# Altium footprint library 3M THD.PcbLib: 163 footprints (part 6 of 14) (continued)
## 3M_N3314-6302RB_a [mm] "3M, 3000 Series, 14 Contacts - Pitch 2.54mm - Straight Four-Wall Header (Black) With Long Roll Pin Latch/Ejectors" (continued)
  text "14" at 9.05,1.525 h1.2
3D body "3M_N3314-6302RB_a.stp": height 27.18, standoff -2.84, extent -18.542,-4.318 18.542,4.318

## 3M_N3408-5202RB [mm] "3M, 3000 Series, 16 Contacts - Pitch 2.54mm - Right Angle Four-Wall Header (Black) With Short Roll Pin Latch/Ejectors"
height 8.6
pads (18):
  round 1.6 hole 0.9: 1(-8.89,-1.27) 2(-8.89,1.27) 3(-6.35,-1.27) 4(-6.35,1.27) 5(-3.81,-1.27) 6(-3.81,1.27) 7(-1.27,-1.27) 8(-1.27,1.27) 9(1.27,-1.27) 10(1.27,1.27) 11(3.81,-1.27) 12(3.81,1.27) 13(6.35,-1.27) 14(6.35,1.27) 15(8.89,-1.27) 16(8.89,1.27)
  round 4.6 hole 2.8: MTG1(-14.796,0.533) MTG2(14.796,0.533)
Top Overlay:
  circle w0.3: c-8.963,-3.048 r0.15
  circle w0.2: c-14.478,6.375 r0.787
  circle w0.2: c14.478,6.375 r0.787
  lines w0.2: -23.217,9.877 -20.639,14.342 ccw(c-20.727,14.393) -20.676,14.481 -23.591,16.163 -28.696,13.216 ccw(c-28.645,13.128) -28.696,13.04 -21.707,9.005 -19.395,6.25 ; -21.604,12.67 -17.848,10.502 ; -17.297,-2.007 -19.812,-2.007 -19.812,5.105 -16.484,14.249 -15.642,14.249 ccw(c-14.478,14.757) -13.208,14.757 -12.366,14.757 -11.924,12.251 ccw(c-10.673,12.471) -10.673,11.201 10.673,11.201 ccw(c10.673,12.471) 11.924,12.251 12.366,14.757 13.208,14.757 ccw(c14.478,14.757) 15.642,14.249 16.484,14.249 19.812,5.105 19.812,-2.007 17.297,-2.007 ; -12.294,-2.007 -10,-2.007 ; -10.154,11.201 -8.884,9.002 -8.347,9.931 ; -8.579,11.201 -8.579,9.931 -6.661,9.931 -6.668,11.201 ; -2.032,5.105 2.032,5.105 ; -2.032,11.201 -2.032,3.581 2.032,3.581 2.032,11.201 ; -1.587,5.105 -1.587,11.201 ; -0.953,5.105 -0.953,11.201 ; 0.953,5.105 0.953,11.201 ; 1.587,5.105 1.587,11.201 ; 6.668,11.201 6.661,9.931 8.579,9.931 8.573,11.201 ; 10,-2.007 12.294,-2.007 ; 17.848,10.502 21.604,12.67 ; 19.395,6.25 21.707,9.005 28.696,13.04 ccw(c28.645,13.128) 28.696,13.216 23.591,16.163 20.676,14.481 ccw(c20.727,14.393) 20.639,14.342 23.217,9.877
  text "16" at 10.15,0.889 h1.02
  text "1" at -10.922,-1.7 h1.02
Mechanical 8:
  lines w0.1: -15.796,0.533 -14.796,0.533 ; -14.796,-0.467 -14.796,0.533 ; -14.796,1.533 -14.796,0.533 ; -13.796,0.533 -14.796,0.533 ; -9.89,-1.27 -8.89,-1.27 ; -9.89,1.27 -8.89,1.27 ; -8.89,-2.27 -8.89,-1.27 ; -8.89,-0.27 -8.89,-1.27 ; -8.89,0.27 -8.89,1.27 ; -8.89,2.27 -8.89,1.27 ; -7.89,-1.27 -8.89,-1.27 ; -7.89,1.27 -8.89,1.27 ; -7.35,-1.27 -6.35,-1.27 ; -7.35,1.27 -6.35,1.27 ; -6.35,-2.27 -6.35,-1.27 ; -6.35,-0.27 -6.35,-1.27 ; -6.35,0.27 -6.35,1.27 ; -6.35,2.27 -6.35,1.27 ; -5.35,-1.27 -6.35,-1.27 ; -5.35,1.27 -6.35,1.27 ; -4.81,-1.27 -3.81,-1.27 ; -4.81,1.27 -3.81,1.27 ; -3.81,-2.27 -3.81,-1.27 ; -3.81,-0.27 -3.81,-1.27 ; -3.81,0.27 -3.81,1.27 ; -3.81,2.27 -3.81,1.27 ; -2.81,-1.27 -3.81,-1.27 ; -2.81,1.27 -3.81,1.27 ; -2.27,-1.27 -1.27,-1.27 ; -2.27,1.27 -1.27,1.27 ; -1.27,-2.27 -1.27,-1.27 ; -1.27,-0.27 -1.27,-1.27 ; -1.27,0.27 -1.27,1.27 ; -1.27,2.27 -1.27,1.27 ; -1,0 0,0 ; -0.27,-1.27 -1.27,-1.27 ; -0.27,1.27 -1.27,1.27 ; 0,-1 0,0 ; 0,1 0,0 ; 0.27,-1.27 1.27,-1.27 ; 0.27,1.27 1.27,1.27 ; 1,0 0,0 ; 1.27,-2.27 1.27,-1.27 ; 1.27,-0.27 1.27,-1.27 ; 1.27,0.27 1.27,1.27 ; 1.27,2.27 1.27,1.27 ; 2.27,-1.27 1.27,-1.27 ; 2.27,1.27 1.27,1.27 ; 2.81,-1.27 3.81,-1.27 ; 2.81,1.27 3.81,1.27 ; 3.81,-2.27 3.81,-1.27 ; 3.81,-0.27 3.81,-1.27 ; 3.81,0.27 3.81,1.27 ; 3.81,2.27 3.81,1.27 ; 4.81,-1.27 3.81,-1.27 ; 4.81,1.27 3.81,1.27 ; 5.35,-1.27 6.35,-1.27 ; 5.35,1.27 6.35,1.27 ; 6.35,-2.27 6.35,-1.27 ; 6.35,-0.27 6.35,-1.27 ; 6.35,0.27 6.35,1.27 ; 6.35,2.27 6.35,1.27 ; 7.35,-1.27 6.35,-1.27 ; 7.35,1.27 6.35,1.27 ; 7.89,-1.27 8.89,-1.27 ; 7.89,1.27 8.89,1.27 ; 8.89,-2.27 8.89,-1.27 ; 8.89,-0.27 8.89,-1.27 ; 8.89,0.27 8.89,1.27 ; 8.89,2.27 8.89,1.27 ; 9.89,-1.27 8.89,-1.27 ; 9.89,1.27 8.89,1.27 ; 13.796,0.533 14.796,0.533 ; 14.796,-0.467 14.796,0.533 ; 14.796,1.533 14.796,0.533 ; 15.796,0.533 14.796,0.533
Mechanical 14:
  circle w0.1: c-14.478,6.375 r0.787
  circle w0.1: c14.478,6.375 r0.787
  circle w0.1: c14.796,0.533 r1.27
  circle w0.1: c-14.796,0.533 r1.27
  lines w0.1: -23.217,9.877 -20.639,14.342 ccw(c-20.727,14.393) -20.676,14.481 -23.591,16.163 -28.696,13.216 ccw(c-28.645,13.128) -28.696,13.04 -21.707,9.005 -19.395,6.25 ; -21.604,12.67 -17.848,10.502 ; -17.297,-2.007 -17.297,1.978 -14.796,3.422 -12.294,1.978 -12.294,-2.007 ; -10.154,11.201 -8.884,9.002 -8.347,9.931 ; -8.579,11.201 -8.579,9.931 -6.661,9.931 -6.668,11.201 ; -2.032,5.105 2.032,5.105 ; -2.032,11.201 -2.032,3.581 2.032,3.581 2.032,11.201 ; -1.587,5.105 -1.587,11.201 ; -0.953,5.105 -0.953,11.201 ; 0.953,5.105 0.953,11.201 ; 1.587,5.105 1.587,11.201 ; 6.668,11.201 6.661,9.931 8.579,9.931 8.573,11.201 ; 12.294,-2.007 12.294,1.978 14.796,3.422 17.297,1.978 17.297,-2.007 ; 17.848,10.502 21.604,12.67 ; 19.395,6.25 21.707,9.005 28.696,13.04 ccw(c28.645,13.128) 28.696,13.216 23.591,16.163 20.676,14.481 ccw(c20.727,14.393) 20.639,14.342 23.217,9.877 ; -19.812,-2.007 -19.812,5.105 -16.484,14.249 -15.642,14.249 ccw(c-14.478,14.757) -13.208,14.757 -12.366,14.757 -11.924,12.251 ccw(c-10.673,12.471) -10.673,11.201 10.673,11.201 ccw(c10.673,12.471) 11.924,12.251 12.366,14.757 13.208,14.757 ccw(c14.478,14.757) 15.642,14.249 16.484,14.249 19.812,5.105 19.812,-2.007 -19.812,-2.007
  text "16" at 10.15,0.889 h1.02
  text "1" at -10.922,-1.7 h1.02
3D body "3M_N3408-5202RB.stp": height 8.64, standoff -2.84, extent -28.741,-2.514 28.741,16.179

## 3M_N3408-5202RB_a [mm] "3M, 3000 Series, 16 Contacts - Pitch 2.54mm - Right Angle Four-Wall Header (Black) With Short Roll Pin Latch/Ejectors"
height 8.6
pads (18):
  round 1.6 hole 0.9: 1(-8.89,-1.27) 2(-8.89,1.27) 3(-6.35,-1.27) 4(-6.35,1.27) 5(-3.81,-1.27) 6(-3.81,1.27) 7(-1.27,-1.27) 8(-1.27,1.27) 9(1.27,-1.27) 10(1.27,1.27) 11(3.81,-1.27) 12(3.81,1.27) 13(6.35,-1.27) 14(6.35,1.27) 15(8.89,-1.27) 16(8.89,1.27)
  round 4.6 hole 2.8: MTG1(-14.796,0.533) MTG2(14.796,0.533)
Top Overlay:
  circle w0.3: c-8.963,-3.048 r0.15
  circle w0.2: c-14.478,6.375 r0.787
  circle w0.2: c14.478,6.375 r0.787
  lines w0.2: -17.297,-2.007 -19.812,-2.007 -19.812,5.105 -16.484,14.249 -15.642,14.249 ccw(c-14.478,14.757) -13.208,14.757 -12.366,14.757 -11.924,12.251 ccw(c-10.673,12.471) -10.673,11.201 10.673,11.201 ccw(c10.673,12.471) 11.924,12.251 12.366,14.757 13.208,14.757 ccw(c14.478,14.757) 15.642,14.249 16.484,14.249 19.812,5.105 19.812,-2.007 17.297,-2.007 ; -15.799,14.249 -15.799,22.024 -15.646,22.112 -10.541,19.164 -10.541,15.799 -10.643,15.697 -15.799,15.697 ; -12.573,14.757 -12.573,20.337 ; -12.294,-2.007 -10,-2.007 ; -10.154,11.201 -8.884,9.002 -8.347,9.931 ; -8.579,11.201 -8.579,9.931 -6.661,9.931 -6.668,11.201 ; -2.032,5.105 2.032,5.105 ; -2.032,11.201 -2.032,3.581 2.032,3.581 2.032,11.201 ; -1.587,5.105 -1.587,11.201 ; -0.953,5.105 -0.953,11.201 ; 0.953,5.105 0.953,11.201 ; 1.587,5.105 1.587,11.201 ; 6.668,11.201 6.661,9.931 8.579,9.931 8.573,11.201 ; 10,-2.007 12.294,-2.007 ; 12.58,14.757 12.58,20.341 ; 15.799,14.249 15.799,22.024 15.646,22.112 10.541,19.164 10.541,15.799 10.643,15.697 15.799,15.697
  text "16" at 10.15,0.889 h1.02
  text "1" at -10.922,-1.7 h1.02
Mechanical 8:
  lines w0.1: -15.796,0.533 -14.796,0.533 ; -14.796,-0.467 -14.796,0.533 ; -14.796,1.533 -14.796,0.533 ; -13.796,0.533 -14.796,0.533 ; -9.89,-1.27 -8.89,-1.27 ; -9.89,1.27 -8.89,1.27 ; -8.89,-2.27 -8.89,-1.27 ; -8.89,-0.27 -8.89,-1.27 ; -8.89,0.27 -8.89,1.27 ; -8.89,2.27 -8.89,1.27 ; -7.89,-1.27 -8.89,-1.27 ; -7.89,1.27 -8.89,1.27 ; -7.35,-1.27 -6.35,-1.27 ; -7.35,1.27 -6.35,1.27 ; -6.35,-2.27 -6.35,-1.27 ; -6.35,-0.27 -6.35,-1.27 ; -6.35,0.27 -6.35,1.27 ; -6.35,2.27 -6.35,1.27 ; -5.35,-1.27 -6.35,-1.27 ; -5.35,1.27 -6.35,1.27 ; -4.81,-1.27 -3.81,-1.27 ; -4.81,1.27 -3.81,1.27 ; -3.81,-2.27 -3.81,-1.27 ; -3.81,-0.27 -3.81,-1.27 ; -3.81,0.27 -3.81,1.27 ; -3.81,2.27 -3.81,1.27 ; -2.81,-1.27 -3.81,-1.27 ; -2.81,1.27 -3.81,1.27 ; -2.27,-1.27 -1.27,-1.27 ; -2.27,1.27 -1.27,1.27 ; -1.27,-2.27 -1.27,-1.27 ; -1.27,-0.27 -1.27,-1.27 ; -1.27,0.27 -1.27,1.27 ; -1.27,2.27 -1.27,1.27 ; -1,0 0,0 ; -0.27,-1.27 -1.27,-1.27 ; -0.27,1.27 -1.27,1.27 ; 0,-1 0,0 ; 0,1 0,0 ; 0.27,-1.27 1.27,-1.27 ; 0.27,1.27 1.27,1.27 ; 1,0 0,0 ; 1.27,-2.27 1.27,-1.27 ; 1.27,-0.27 1.27,-1.27 ; 1.27,0.27 1.27,1.27 ; 1.27,2.27 1.27,1.27 ; 2.27,-1.27 1.27,-1.27 ; 2.27,1.27 1.27,1.27 ; 2.81,-1.27 3.81,-1.27 ; 2.81,1.27 3.81,1.27 ; 3.81,-2.27 3.81,-1.27 ; 3.81,-0.27 3.81,-1.27 ; 3.81,0.27 3.81,1.27 ; 3.81,2.27 3.81,1.27 ; 4.81,-1.27 3.81,-1.27 ; 4.81,1.27 3.81,1.27 ; 5.35,-1.27 6.35,-1.27 ; 5.35,1.27 6.35,1.27 ; 6.35,-2.27 6.35,-1.27 ; 6.35,-0.27 6.35,-1.27 ; 6.35,0.27 6.35,1.27 ; 6.35,2.27 6.35,1.27 ; 7.35,-1.27 6.35,-1.27 ; 7.35,1.27 6.35,1.27 ; 7.89,-1.27 8.89,-1.27 ; 7.89,1.27 8.89,1.27 ; 8.89,-2.27 8.89,-1.27 ; 8.89,-0.27 8.89,-1.27 ; 8.89,0.27 8.89,1.27 ; 8.89,2.27 8.89,1.27 ; 9.89,-1.27 8.89,-1.27 ; 9.89,1.27 8.89,1.27 ; 13.796,0.533 14.796,0.533 ; 14.796,-0.467 14.796,0.533 ; 14.796,1.533 14.796,0.533 ; 15.796,0.533 14.796,0.533
Mechanical 14:
  circle w0.1: c-14.478,6.375 r0.787
  circle w0.1: c14.478,6.375 r0.787
  circle w0.1: c14.796,0.533 r1.27
  circle w0.1: c-14.796,0.533 r1.27
  lines w0.1: -17.297,-2.007 -17.297,1.978 -14.796,3.422 -12.294,1.978 -12.294,-2.007 ; -15.799,14.249 -15.799,22.024 -15.646,22.112 -10.541,19.164 -10.541,15.799 -10.643,15.697 -15.799,15.697 ; -12.573,14.757 -12.573,20.337 ; -10.154,11.201 -8.884,9.002 -8.347,9.931 ; -8.579,11.201 -8.579,9.931 -6.661,9.931 -6.668,11.201 ; -2.032,5.105 2.032,5.105 ; -2.032,11.201 -2.032,3.581 2.032,3.581 2.032,11.201 ; -1.587,5.105 -1.587,11.201 ; -0.953,5.105 -0.953,11.201 ; 0.953,5.105 0.953,11.201 ; 1.587,5.105 1.587,11.201 ; 6.668,11.201 6.661,9.931 8.579,9.931 8.573,11.201 ; 12.294,-2.007 12.294,1.978 14.796,3.422 17.297,1.978 17.297,-2.007 ; 12.58,20.341 12.597,14.757 ; 15.799,14.249 15.799,22.024 15.646,22.112 10.541,19.164 10.541,15.799 10.643,15.697 15.799,15.697 ; -19.812,-2.007 -19.812,5.105 -16.484,14.249 -15.642,14.249 ccw(c-14.478,14.757) -13.208,14.757 -12.366,14.757 -11.924,12.251 ccw(c-10.673,12.471) -10.673,11.201 10.673,11.201 ccw(c10.673,12.471) 11.924,12.251 12.366,14.757 13.208,14.757 ccw(c14.478,14.757) 15.642,14.249 16.484,14.249 19.812,5.105 19.812,-2.007 -19.812,-2.007
  text "16" at 10.15,0.889 h1.02
  text "1" at -10.922,-1.7 h1.02
3D body "3M_N3408-5202RB_a.stp": height 8.64, standoff -2.84, extent -19.812,-2.514 19.812,22.125

## 3M_N3408-5302RB [mm] "3M, 3000 Series, 16 Contacts - Pitch 2.54mm - Right Angle Four-Wall Header (Black) With Long Roll Pin Latch/Ejectors"
height 8.6
pads (18):
  round 1.6 hole 0.9: 1(-8.89,-1.27) 2(-8.89,1.27) 3(-6.35,-1.27) 4(-6.35,1.27) 5(-3.81,-1.27) 6(-3.81,1.27) 7(-1.27,-1.27) 8(-1.27,1.27) 9(1.27,-1.27) 10(1.27,1.27) 11(3.81,-1.27) 12(3.81,1.27) 13(6.35,-1.27) 14(6.35,1.27) 15(8.89,-1.27) 16(8.89,1.27)
  round 4.6 hole 2.8: MTG1(-14.796,0.533) MTG2(14.796,0.533)
Top Overlay:
  circle w0.3: c-8.963,-3.048 r0.15
  circle w0.2: c-14.478,6.375 r0.787
  circle w0.2: c14.478,6.375 r0.787
  lines w0.2: -27.817,16.269 -17.855,10.482 ; -25.411,11.155 -22.833,15.621 -22.87,15.759 -25.785,17.442 -30.89,14.494 -30.89,14.318 -21.703,9.014 -19.5,5.963 ; -16.7,-2.007 -19.812,-2.007 -19.812,5.105 -16.484,14.249 -15.642,14.249 ccw(c-14.478,14.757) -13.208,14.757 -12.366,14.757 -11.924,12.251 ccw(c-10.673,12.471) -10.673,11.201 10.673,11.201 ccw(c10.673,12.471) 11.924,12.251 12.366,14.757 13.208,14.757 ccw(c14.478,14.757) 15.642,14.249 16.484,14.249 19.812,5.105 19.812,-2.007 16.7,-2.007 ; -10.154,11.201 -8.884,9.002 -8.347,9.931 ; -8.579,11.201 -8.579,9.931 -6.661,9.931 -6.668,11.201 ; -2.032,5.105 2.032,5.105 ; -2.032,11.201 -2.032,3.581 2.032,3.581 2.032,11.201 ; -1.587,5.105 -1.587,11.201 ; -0.953,5.105 -0.953,11.201 ; 0.953,5.105 0.953,11.201 ; 1.587,5.105 1.587,11.201 ; 6.668,11.201 6.661,9.931 8.579,9.931 8.573,11.201 ; 17.855,10.482 27.817,16.269 ; 19.5,5.963 21.703,9.014 30.89,14.318 ; 25.411,11.155 22.833,15.621 22.87,15.759 25.785,17.442 30.89,14.494
  text "16" at 10.15,0.889 h1.02
  text "1" at -10.922,-1.7 h1.02
Mechanical 8:
  lines w0.1: -15.796,0.533 -14.796,0.533 ; -14.796,-0.467 -14.796,0.533 ; -14.796,1.533 -14.796,0.533 ; -13.796,0.533 -14.796,0.533 ; -9.89,-1.27 -8.89,-1.27 ; -9.89,1.27 -8.89,1.27 ; -8.89,-2.27 -8.89,-1.27 ; -8.89,-0.27 -8.89,-1.27 ; -8.89,0.27 -8.89,1.27 ; -8.89,2.27 -8.89,1.27 ; -7.89,-1.27 -8.89,-1.27 ; -7.89,1.27 -8.89,1.27 ; -7.35,-1.27 -6.35,-1.27 ; -7.35,1.27 -6.35,1.27 ; -6.35,-2.27 -6.35,-1.27 ; -6.35,-0.27 -6.35,-1.27 ; -6.35,0.27 -6.35,1.27 ; -6.35,2.27 -6.35,1.27 ; -5.35,-1.27 -6.35,-1.27 ; -5.35,1.27 -6.35,1.27 ; -4.81,-1.27 -3.81,-1.27 ; -4.81,1.27 -3.81,1.27 ; -3.81,-2.27 -3.81,-1.27 ; -3.81,-0.27 -3.81,-1.27 ; -3.81,0.27 -3.81,1.27 ; -3.81,2.27 -3.81,1.27 ; -2.81,-1.27 -3.81,-1.27 ; -2.81,1.27 -3.81,1.27 ; -2.27,-1.27 -1.27,-1.27 ; -2.27,1.27 -1.27,1.27 ; -1.27,-2.27 -1.27,-1.27 ; -1.27,-0.27 -1.27,-1.27 ; -1.27,0.27 -1.27,1.27 ; -1.27,2.27 -1.27,1.27 ; -1,0 0,0 ; -0.27,-1.27 -1.27,-1.27 ; -0.27,1.27 -1.27,1.27 ; 0,-1 0,0 ; 0,1 0,0 ; 0.27,-1.27 1.27,-1.27 ; 0.27,1.27 1.27,1.27 ; 1,0 0,0 ; 1.27,-2.27 1.27,-1.27 ; 1.27,-0.27 1.27,-1.27 ; 1.27,0.27 1.27,1.27 ; 1.27,2.27 1.27,1.27 ; 2.27,-1.27 1.27,-1.27 ; 2.27,1.27 1.27,1.27 ; 2.81,-1.27 3.81,-1.27 ; 2.81,1.27 3.81,1.27 ; 3.81,-2.27 3.81,-1.27 ; 3.81,-0.27 3.81,-1.27 ; 3.81,0.27 3.81,1.27 ; 3.81,2.27 3.81,1.27 ; 4.81,-1.27 3.81,-1.27 ; 4.81,1.27 3.81,1.27 ; 5.35,-1.27 6.35,-1.27 ; 5.35,1.27 6.35,1.27 ; 6.35,-2.27 6.35,-1.27 ; 6.35,-0.27 6.35,-1.27 ; 6.35,0.27 6.35,1.27 ; 6.35,2.27 6.35,1.27 ; 7.35,-1.27 6.35,-1.27 ; 7.35,1.27 6.35,1.27 ; 7.89,-1.27 8.89,-1.27 ; 7.89,1.27 8.89,1.27 ; 8.89,-2.27 8.89,-1.27 ; 8.89,-0.27 8.89,-1.27 ; 8.89,0.27 8.89,1.27 ; 8.89,2.27 8.89,1.27 ; 9.89,-1.27 8.89,-1.27 ; 9.89,1.27 8.89,1.27 ; 13.796,0.533 14.796,0.533 ; 14.796,-0.467 14.796,0.533 ; 14.796,1.533 14.796,0.533 ; 15.796,0.533 14.796,0.533
Mechanical 14:
  circle w0.1: c-14.478,6.375 r0.787
  circle w0.1: c14.478,6.375 r0.787
  circle w0.1: c14.796,0.533 r1.27
  circle w0.1: c-14.796,0.533 r1.27
  lines w0.1: -27.817,16.269 -17.855,10.482 ; -25.411,11.155 -22.833,15.621 -22.87,15.759 -25.785,17.442 -30.89,14.494 -30.89,14.318 -21.703,9.014 -19.5,5.963 ; -17.297,-2.007 -17.297,1.978 -14.796,3.422 -12.294,1.978 -12.294,-2.007 ; -10.154,11.201 -8.884,9.002 -8.347,9.931 ; -8.579,11.201 -8.579,9.931 -6.661,9.931 -6.668,11.201 ; -2.032,5.105 2.032,5.105 ; -2.032,11.201 -2.032,3.581 2.032,3.581 2.032,11.201 ; -1.587,5.105 -1.587,11.201 ; -0.953,5.105 -0.953,11.201 ; 0.953,5.105 0.953,11.201 ; 1.587,5.105 1.587,11.201 ; 6.668,11.201 6.661,9.931 8.579,9.931 8.573,11.201 ; 12.294,-2.007 12.294,1.978 14.796,3.422 17.297,1.978 17.297,-2.007 ; 17.855,10.482 27.817,16.269 ; 19.5,5.963 21.703,9.014 30.89,14.318 ; 25.411,11.155 22.833,15.621 22.87,15.759 25.785,17.442 30.89,14.494 ; -19.812,-2.007 -19.812,5.105 -16.484,14.249 -15.642,14.249 ccw(c-14.478,14.757) -13.208,14.757 -12.366,14.757 -11.924,12.251 ccw(c-10.673,12.471) -10.673,11.201 10.673,11.201 ccw(c10.673,12.471) 11.924,12.251 12.366,14.757 13.208,14.757 ccw(c14.478,14.757) 15.642,14.249 16.484,14.249 19.812,5.105 19.812,-2.007 -19.812,-2.007
  text "16" at 10.15,0.889 h1.02
  text "1" at -10.922,-1.7 h1.02
3D body "3M_N3408-5302RB.stp": height 8.64, standoff -2.84, extent -30.938,-2.514 30.939,17.448

## 3M_N3408-5302RB_a [mm] "3M, 3000 Series, 16 Contacts - Pitch 2.54mm - Right Angle Four-Wall Header (Black) With Long Roll Pin Latch/Ejectors"
height 8.6
pads (18):
  round 1.6 hole 0.9: 1(-8.89,-1.27) 2(-8.89,1.27) 3(-6.35,-1.27) 4(-6.35,1.27) 5(-3.81,-1.27) 6(-3.81,1.27) 7(-1.27,-1.27) 8(-1.27,1.27) 9(1.27,-1.27) 10(1.27,1.27) 11(3.81,-1.27) 12(3.81,1.27) 13(6.35,-1.27) 14(6.35,1.27) 15(8.89,-1.27) 16(8.89,1.27)
  round 4.6 hole 2.8: MTG1(-14.796,0.533) MTG2(14.796,0.533)
Top Overlay:
  circle w0.3: c-8.963,-3.048 r0.15
  circle w0.2: c-14.478,6.375 r0.787
  circle w0.2: c14.478,6.375 r0.787
  lines w0.2: -16.7,-2.007 -19.812,-2.007 -19.812,5.105 -16.484,14.249 -15.642,14.249 ccw(c-14.478,14.757) -13.208,14.757 -12.366,14.757 -11.924,12.251 ccw(c-10.673,12.471) -10.673,11.201 10.673,11.201 ccw(c10.673,12.471) 11.924,12.251 12.366,14.757 13.208,14.757 ccw(c14.478,14.757) 15.642,14.249 16.484,14.249 19.812,5.105 19.812,-2.007 16.7,-2.007 ; -15.799,14.249 -15.799,24.561 -15.646,24.649 -10.541,21.702 -10.541,18.336 -10.643,18.235 -15.799,18.235 ; -12.573,14.757 -12.573,22.875 ; -10.154,11.201 -8.884,9.002 -8.347,9.931 ; -8.579,11.201 -8.579,9.931 -6.661,9.931 -6.668,11.201 ; -2.032,5.105 2.032,5.105 ; -2.032,11.201 -2.032,3.581 2.032,3.581 2.032,11.201 ; -1.587,5.105 -1.587,11.201 ; -0.953,5.105 -0.953,11.201 ; 0.953,5.105 0.953,11.201 ; 1.587,5.105 1.587,11.201 ; 6.668,11.201 6.661,9.931 8.579,9.931 8.573,11.201 ; 12.573,14.757 12.573,22.875 ; 15.799,14.249 15.799,24.561 15.646,24.649 10.541,21.702 10.541,18.336 10.643,18.235 15.799,18.235
  text "16" at 10.15,0.889 h1.02
  text "1" at -10.922,-1.7 h1.02
Mechanical 8:
  lines w0.1: -15.796,0.533 -14.796,0.533 ; -14.796,-0.467 -14.796,0.533 ; -14.796,1.533 -14.796,0.533 ; -13.796,0.533 -14.796,0.533 ; -9.89,-1.27 -8.89,-1.27 ; -9.89,1.27 -8.89,1.27 ; -8.89,-2.27 -8.89,-1.27 ; -8.89,-0.27 -8.89,-1.27 ; -8.89,0.27 -8.89,1.27 ; -8.89,2.27 -8.89,1.27 ; -7.89,-1.27 -8.89,-1.27 ; -7.89,1.27 -8.89,1.27 ; -7.35,-1.27 -6.35,-1.27 ; -7.35,1.27 -6.35,1.27 ; -6.35,-2.27 -6.35,-1.27 ; -6.35,-0.27 -6.35,-1.27 ; -6.35,0.27 -6.35,1.27 ; -6.35,2.27 -6.35,1.27 ; -5.35,-1.27 -6.35,-1.27 ; -5.35,1.27 -6.35,1.27 ; -4.81,-1.27 -3.81,-1.27 ; -4.81,1.27 -3.81,1.27 ; -3.81,-2.27 -3.81,-1.27 ; -3.81,-0.27 -3.81,-1.27 ; -3.81,0.27 -3.81,1.27 ; -3.81,2.27 -3.81,1.27 ; -2.81,-1.27 -3.81,-1.27 ; -2.81,1.27 -3.81,1.27 ; -2.27,-1.27 -1.27,-1.27 ; -2.27,1.27 -1.27,1.27 ; -1.27,-2.27 -1.27,-1.27 ; -1.27,-0.27 -1.27,-1.27 ; -1.27,0.27 -1.27,1.27 ; -1.27,2.27 -1.27,1.27 ; -1,0 0,0 ; -0.27,-1.27 -1.27,-1.27 ; -0.27,1.27 -1.27,1.27 ; 0,-1 0,0 ; 0,1 0,0 ; 0.27,-1.27 1.27,-1.27 ; 0.27,1.27 1.27,1.27 ; 1,0 0,0 ; 1.27,-2.27 1.27,-1.27 ; 1.27,-0.27 1.27,-1.27 ; 1.27,0.27 1.27,1.27 ; 1.27,2.27 1.27,1.27 ; 2.27,-1.27 1.27,-1.27 ; 2.27,1.27 1.27,1.27 ; 2.81,-1.27 3.81,-1.27 ; 2.81,1.27 3.81,1.27 ; 3.81,-2.27 3.81,-1.27 ; 3.81,-0.27 3.81,-1.27 ; 3.81,0.27 3.81,1.27 ; 3.81,2.27 3.81,1.27 ; 4.81,-1.27 3.81,-1.27 ; 4.81,1.27 3.81,1.27 ; 5.35,-1.27 6.35,-1.27 ; 5.35,1.27 6.35,1.27 ; 6.35,-2.27 6.35,-1.27 ; 6.35,-0.27 6.35,-1.27 ; 6.35,0.27 6.35,1.27 ; 6.35,2.27 6.35,1.27 ; 7.35,-1.27 6.35,-1.27 ; 7.35,1.27 6.35,1.27 ; 7.89,-1.27 8.89,-1.27 ; 7.89,1.27 8.89,1.27 ; 8.89,-2.27 8.89,-1.27 ; 8.89,-0.27 8.89,-1.27 ; 8.89,0.27 8.89,1.27 ; 8.89,2.27 8.89,1.27 ; 9.89,-1.27 8.89,-1.27 ; 9.89,1.27 8.89,1.27 ; 13.796,0.533 14.796,0.533 ; 14.796,-0.467 14.796,0.533 ; 14.796,1.533 14.796,0.533 ; 15.796,0.533 14.796,0.533
Mechanical 14:
  circle w0.1: c-14.478,6.375 r0.787
  circle w0.1: c14.478,6.375 r0.787
  circle w0.1: c14.796,0.533 r1.27
  circle w0.1: c-14.796,0.533 r1.27
  lines w0.1: -17.297,-2.007 -17.297,1.978 -14.796,3.422 -12.294,1.978 -12.294,-2.007 ; -15.799,14.249 -15.799,24.561 -15.646,24.649 -10.541,21.702 -10.541,18.336 -10.643,18.235 -15.799,18.235 ; -12.573,14.757 -12.573,22.875 ; -10.154,11.201 -8.884,9.002 -8.347,9.931 ; -8.579,11.201 -8.579,9.931 -6.661,9.931 -6.668,11.201 ; -2.032,5.105 2.032,5.105 ; -2.032,11.201 -2.032,3.581 2.032,3.581 2.032,11.201 ; -1.587,5.105 -1.587,11.201 ; -0.953,5.105 -0.953,11.201 ; 0.953,5.105 0.953,11.201 ; 1.587,5.105 1.587,11.201 ; 6.668,11.201 6.661,9.931 8.579,9.931 8.573,11.201 ; 12.294,-2.007 12.294,1.978 14.796,3.422 17.297,1.978 17.297,-2.007 ; 12.573,22.875 12.597,14.757 ; 15.799,14.249 15.799,24.561 15.646,24.649 10.541,21.702 10.541,18.336 10.643,18.235 15.799,18.235 ; -19.812,-2.007 -19.812,5.105 -16.484,14.249 -15.642,14.249 ccw(c-14.478,14.757) -13.208,14.757 -12.366,14.757 -11.924,12.251 ccw(c-10.673,12.471) -10.673,11.201 10.673,11.201 ccw(c10.673,12.471) 11.924,12.251 12.366,14.757 13.208,14.757 ccw(c14.478,14.757) 15.642,14.249 16.484,14.249 19.812,5.105 19.812,-2.007 -19.812,-2.007
  text "16" at 10.15,0.889 h1.02
  text "1" at -10.922,-1.7 h1.02
3D body "3M_N3408-5302RB_a.stp": height 8.64, standoff -2.84, extent -19.812,-2.514 19.812,24.663

## 3M_N3408-6202RB [mm] "3M, 3000 Series, 16 Contacts - Pitch 2.54mm - Straight Four-Wall Header (Black) With Short Roll Pin Latch/Ejectors"
height 24.6
pads (18):
  round 1.6 hole 0.9: 1(-8.89,-1.27) 2(-8.89,1.27) 3(-6.35,-1.27) 4(-6.35,1.27) 5(-3.81,-1.27) 6(-3.81,1.27) 7(-1.27,-1.27) 8(-1.27,1.27) 9(1.27,-1.27) 10(1.27,1.27) 11(3.81,-1.27) 12(3.81,1.27) 13(6.35,-1.27) 14(6.35,1.27) 15(8.89,-1.27) 16(8.89,1.27)
  round 4.6 hole 2.8: MTG1(-17.83,-0.254) MTG2(17.83,-0.254)
Top Overlay:
  lines w0.2: -19.812,-2 -19.812,-4.318 19.812,-4.318 19.812,-2 ; -19.812,1.7 -19.812,4.3 ; -19.812,4.318 19.812,4.318 ; -2.032,-4.318 -2.032,-3.175 ; 2.032,-4.318 2.032,-3.175 ; 19.812,1.7 19.812,4.3 ; -12.827,-3.175 12.827,-3.175 12.827,3.175 -12.827,3.175 -12.827,-3.175 ; -10.16,-3.175 -7.62,-3.175 -8.89,-4.318 -10.16,-3.175
  text "1" at -11.227,-2.921 h1.02
  text "16" at 10.125,1.727 h1.02
Mechanical 8:
  lines w0.1: -18.83,-0.254 -17.83,-0.254 ; -17.83,-1.254 -17.83,-0.254 ; -17.83,0.746 -17.83,-0.254 ; -16.83,-0.254 -17.83,-0.254 ; -9.89,-1.27 -8.89,-1.27 ; -9.89,1.27 -8.89,1.27 ; -8.89,-2.27 -8.89,-1.27 ; -8.89,-0.27 -8.89,-1.27 ; -8.89,0.27 -8.89,1.27 ; -8.89,2.27 -8.89,1.27 ; -7.89,-1.27 -8.89,-1.27 ; -7.89,1.27 -8.89,1.27 ; -7.35,-1.27 -6.35,-1.27 ; -7.35,1.27 -6.35,1.27 ; -6.35,-2.27 -6.35,-1.27 ; -6.35,-0.27 -6.35,-1.27 ; -6.35,0.27 -6.35,1.27 ; -6.35,2.27 -6.35,1.27 ; -5.35,-1.27 -6.35,-1.27 ; -5.35,1.27 -6.35,1.27 ; -4.81,-1.27 -3.81,-1.27 ; -4.81,1.27 -3.81,1.27 ; -3.81,-2.27 -3.81,-1.27 ; -3.81,-0.27 -3.81,-1.27 ; -3.81,0.27 -3.81,1.27 ; -3.81,2.27 -3.81,1.27 ; -2.81,-1.27 -3.81,-1.27 ; -2.81,1.27 -3.81,1.27 ; -2.27,-1.27 -1.27,-1.27 ; -2.27,1.27 -1.27,1.27 ; -1.27,-2.27 -1.27,-1.27 ; -1.27,-0.27 -1.27,-1.27 ; -1.27,0.27 -1.27,1.27 ; -1.27,2.27 -1.27,1.27 ; -1,0 0,0 ; -0.27,-1.27 -1.27,-1.27 ; -0.27,1.27 -1.27,1.27 ; 0,-1 0,0 ; 0,1 0,0 ; 0.27,-1.27 1.27,-1.27 ; 0.27,1.27 1.27,1.27 ; 1,0 0,0 ; 1.27,-2.27 1.27,-1.27 ; 1.27,-0.27 1.27,-1.27 ; 1.27,0.27 1.27,1.27 ; 1.27,2.27 1.27,1.27 ; 2.27,-1.27 1.27,-1.27 ; 2.27,1.27 1.27,1.27 ; 2.81,-1.27 3.81,-1.27 ; 2.81,1.27 3.81,1.27 ; 3.81,-2.27 3.81,-1.27 ; 3.81,-0.27 3.81,-1.27 ; 3.81,0.27 3.81,1.27 ; 3.81,2.27 3.81,1.27 ; 4.81,-1.27 3.81,-1.27 ; 4.81,1.27 3.81,1.27 ; 5.35,-1.27 6.35,-1.27 ; 5.35,1.27 6.35,1.27 ; 6.35,-2.27 6.35,-1.27 ; 6.35,-0.27 6.35,-1.27 ; 6.35,0.27 6.35,1.27 ; 6.35,2.27 6.35,1.27 ; 7.35,-1.27 6.35,-1.27 ; 7.35,1.27 6.35,1.27 ; 7.89,-1.27 8.89,-1.27 ; 7.89,1.27 8.89,1.27 ; 8.89,-2.27 8.89,-1.27 ; 8.89,-0.27 8.89,-1.27 ; 8.89,0.27 8.89,1.27 ; 8.89,2.27 8.89,1.27 ; 9.89,-1.27 8.89,-1.27 ; 9.89,1.27 8.89,1.27 ; 16.844,-0.254 17.844,-0.254 ; 17.844,-1.254 17.844,-0.254 ; 17.844,0.746 17.844,-0.254 ; 18.844,-0.254 17.844,-0.254
Mechanical 14:
  circle w0.1: c17.844,-0.254 r1.27
  circle w0.1: c-17.844,-0.254 r1.27
  lines w0.1: -19.812,-3.175 -16.484,-3.175 ; -16.484,-4.318 -16.484,-1.727 -9.525,-1.727 -9.525,1.27 -16.484,1.27 -16.484,4.318 ; -15.642,-4.318 -15.642,-1.727 ; -15.642,1.27 -15.642,4.318 ; -13.209,-4.318 -13.208,-1.727 ; -12.827,-1.727 -12.827,-3.175 12.827,-3.175 12.827,-1.727 ; -12.827,1.27 -12.827,3.175 12.827,3.175 12.827,1.27 ; -6.039,-4.318 -6.039,-3.175 ; -4.121,-4.318 -4.121,-3.175 ; -2.032,-4.318 -2.032,-3.175 ; 2.032,-4.318 2.032,-3.175 ; 6.661,-4.318 6.661,-3.175 ; 8.579,-4.318 8.579,-3.175 ; 12.366,-4.318 12.366,-3.175 ; 12.366,3.175 12.366,4.318 ; 13.208,1.27 13.208,4.318 ; 13.249,-4.318 13.249,-1.727 ; 15.642,-4.318 15.642,-1.727 ; 15.642,1.27 15.642,4.318 ; 16.484,-4.318 16.484,-1.727 9.525,-1.727 9.525,1.27 16.484,1.27 16.484,4.318 ; 16.484,-3.175 19.812,-3.175 ; 16.484,3.175 19.812,3.175 ; -19.812,-4.318 -19.812,4.318 19.812,4.318 19.812,-4.318 -19.812,-4.318 ; -19.812,3.175 -16.484,3.175 -19.812,3.175 ; -19.368,-1.134 -17.844,-2.014 -16.32,-1.134 -16.32,0.626 -17.844,1.506 -19.368,0.626 -19.368,-1.134 ; -13.208,1.27 -13.208,4.318 -13.208,1.27 ; -12.366,-4.318 -12.366,-3.175 -12.366,-4.318 ; -12.366,3.175 -12.366,4.318 -12.366,3.175 ; 16.32,-1.134 17.844,-2.014 19.368,-1.134 19.368,0.626 17.844,1.506 16.32,0.626 16.32,-1.134
  text "1" at -11.227,-2.921 h1.02
  text "16" at 10.125,1.727 h1.02
3D body "3M_N3408-6202RB.stp": height 18.69, standoff -2.84, extent -28.741,-4.318 28.741,4.318